# Altium footprint library 10-Diobe.PcbLib: 108 footprints (part 5 of 7)
Each footprint in its own frame and in the unit in brackets; x right, y up, seen from the top. Pads: shape width x height; smd on the part's side, far side on the other; paste and mask are expansions set on the pad; w line width, h text height; cw(c..) or ccw(c..) is an arc to the next point about the centre after c.
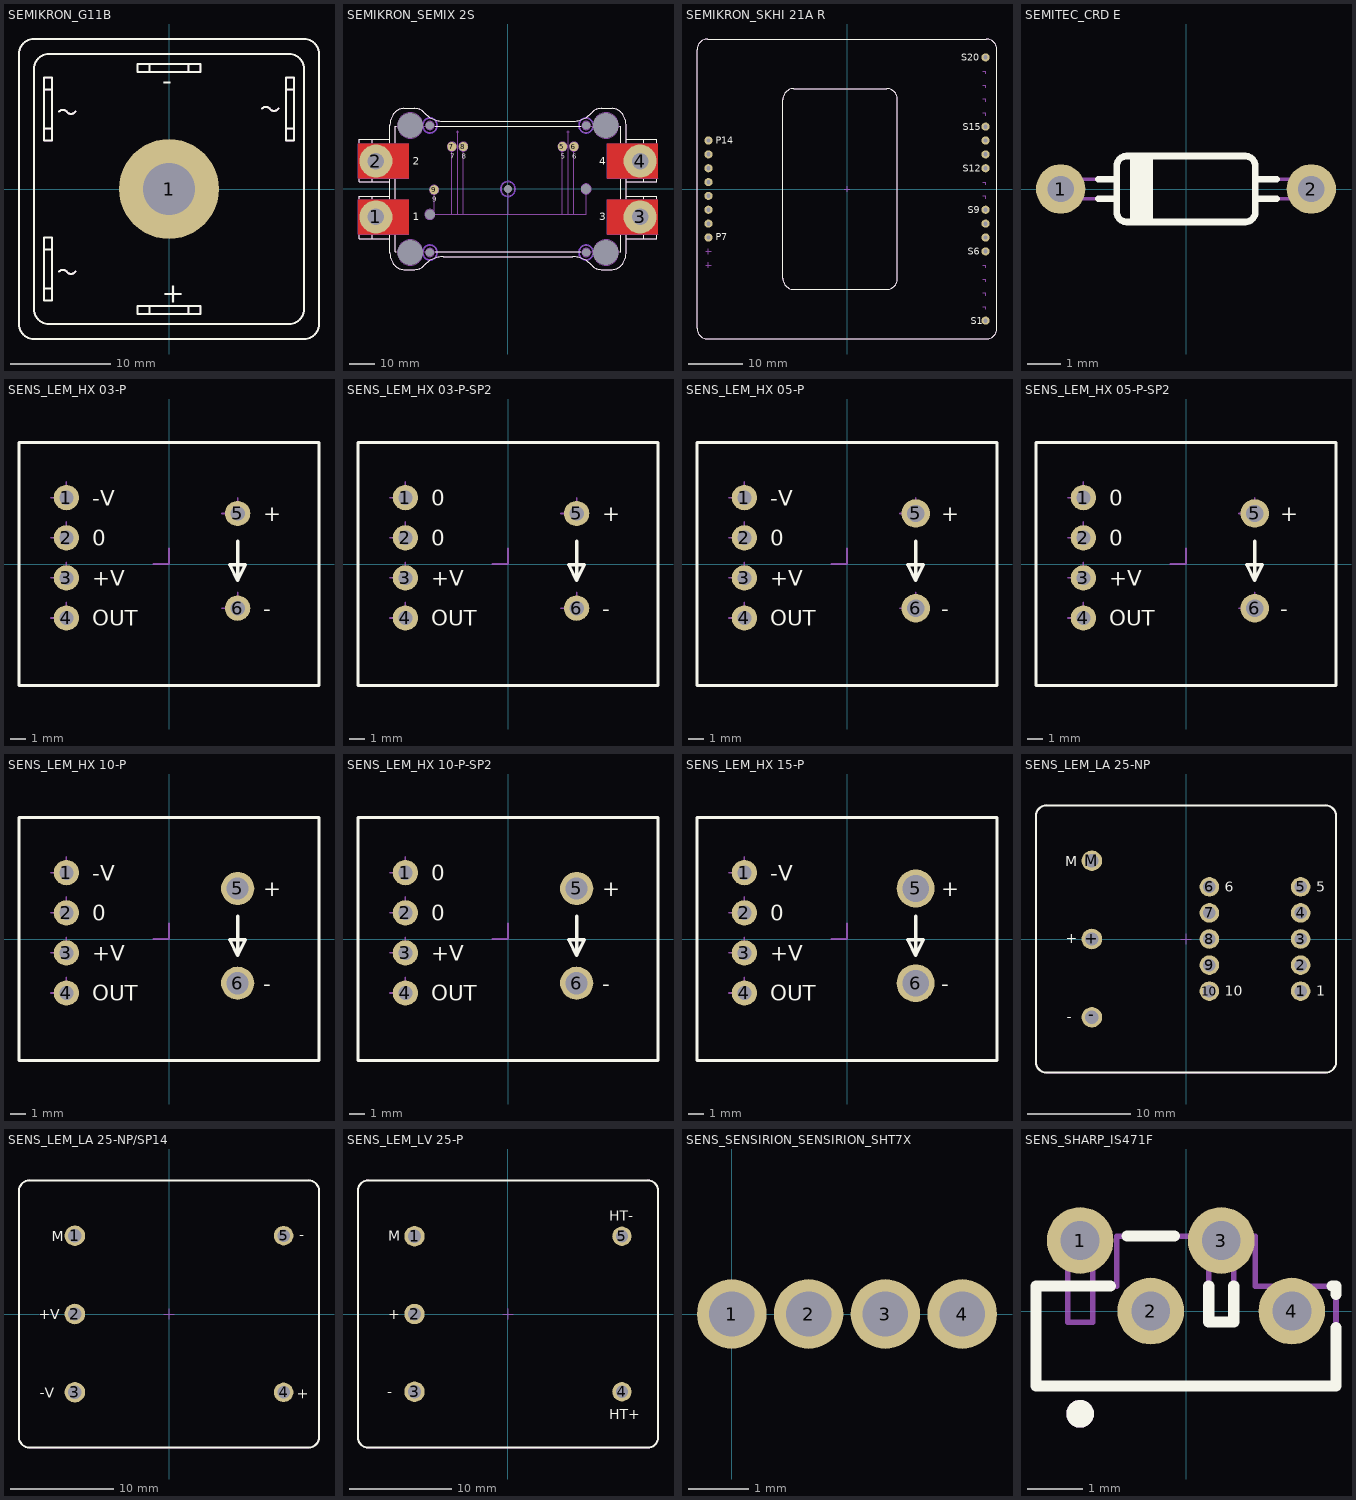
[diagram p4: the footprints below, top view; thin cyan lines are the x and y axes]

## SEMIKRON_G11B [mm] "Three Phase Bridge Bridge, Body 28.8mm x 28.8mm G11b Case"
height 22.5
pads (1):
  round 10 hole 5.2: 1(0,0)
Top Overlay:
  lines w0.2: -12.5,-9.95 -11.7,-9.95 ; -12.5,-6.05 -11.7,-6.05 ; -12.5,6.05 -11.7,6.05 ; -12.5,9.95 -11.7,9.95 ; -10.975,-8.232 cw(c-10.615,-8.579) -10.2,-8.3 ; -10.975,7.768 cw(c-10.615,7.421) -10.2,7.7 ; -10.175,-8.32 ccw(c-9.794,-7.996) -9.365,-8.254 ; -10.175,7.68 ccw(c-9.794,8.004) -9.365,7.746 ; -1.95,-12.5 -1.95,-11.7 ; -1.95,11.7 -1.95,12.5 ; 1.95,-12.5 1.95,-11.7 ; 1.95,11.7 1.95,12.5 ; 9.325,8.068 cw(c9.685,7.721) 10.1,8 ; 10.125,7.98 ccw(c10.506,8.304) 10.935,8.046 ; 11.7,6.05 12.5,6.05 ; 11.7,9.95 12.5,9.95 ; -15,-13.5 ccw(c-13.5,-13.5) -13.5,-15 13.5,-15 ccw(c13.5,-13.5) 15,-13.5 15,13.5 ccw(c13.5,13.5) 13.5,15 -13.5,15 ccw(c-13.5,13.5) -15,13.5 -15,-13.5 ; -13.5,-12 ccw(c-12,-12) -12,-13.5 12,-13.5 ccw(c12,-12) 13.5,-12 13.5,12 ccw(c12,12) 12,13.5 -12,13.5 ccw(c-12,12) -13.5,12 -13.5,-12 ; -12.5,-11.15 -11.7,-11.15 -11.7,-4.85 -12.5,-4.85 -12.5,-11.15 ; -12.5,4.85 -11.7,4.85 -11.7,11.15 -12.5,11.15 -12.5,4.85 ; -3.15,-12.5 -3.15,-11.7 3.15,-11.7 3.15,-12.5 -3.15,-12.5 ; -3.15,11.7 -3.15,12.5 3.15,12.5 3.15,11.7 -3.15,11.7 ; 11.7,4.85 12.5,4.85 12.5,11.15 11.7,11.15 11.7,4.85
  text "+" at -0.7,-11.4 h2
  text "-" at -0.7,9.9 h2
Mechanical 8:
  lines w0.1: -1,0 0,0 ; 0,-1 0,0 ; 0,1 0,0 ; 1,0 0,0
Mechanical 14:
  circle w0.1: c0,0 r2.6
  circle w0.1: c0,0 r4.1
  circle w0.1: c0,0 r2.6
  lines w0.1: -12.5,-9.95 -11.7,-9.95 ; -12.5,-6.05 -11.7,-6.05 ; -12.5,6.05 -11.7,6.05 ; -12.5,9.95 -11.7,9.95 ; -1.95,-12.5 -1.95,-11.7 ; -1.95,11.7 -1.95,12.5 ; 1.95,-12.5 1.95,-11.7 ; 1.95,11.7 1.95,12.5 ; 11.7,6.05 12.5,6.05 ; 11.7,9.95 12.5,9.95 ; -15,-13.5 ccw(c-13.5,-13.5) -13.5,-15 13.5,-15 ccw(c13.5,-13.5) 15,-13.5 15,13.5 ccw(c13.5,13.5) 13.5,15 -13.5,15 ccw(c-13.5,13.5) -15,13.5 -15,-13.5 ; -13.5,-12 ccw(c-12,-12) -12,-13.5 12,-13.5 ccw(c12,-12) 13.5,-12 13.5,12 ccw(c12,12) 12,13.5 -12,13.5 ccw(c-12,12) -13.5,12 -13.5,-12 ; -12.5,-11.15 -11.7,-11.15 -11.7,-4.85 -12.5,-4.85 -12.5,-11.15 ; -12.5,4.85 -11.7,4.85 -11.7,11.15 -12.5,11.15 -12.5,4.85 ; -3.15,-12.5 -3.15,-11.7 3.15,-11.7 3.15,-12.5 -3.15,-12.5 ; -3.15,11.7 -3.15,12.5 3.15,12.5 3.15,11.7 -3.15,11.7 ; 11.7,4.85 12.5,4.85 12.5,11.15 11.7,11.15 11.7,4.85
  lines w0.2: -10.975,-8.232 cw(c-10.615,-8.579) -10.2,-8.3 ; -10.975,-8.232 cw(c-10.615,-8.579) -10.2,-8.3 ; -10.975,-8.232 cw(c-10.615,-8.579) -10.2,-8.3 ; -10.975,7.768 cw(c-10.615,7.421) -10.2,7.7 ; -10.975,7.768 cw(c-10.615,7.421) -10.2,7.7 ; -10.975,7.768 cw(c-10.615,7.421) -10.2,7.7 ; -10.175,-8.32 ccw(c-9.794,-7.996) -9.365,-8.254 ; -10.175,-8.32 ccw(c-9.794,-7.996) -9.365,-8.254 ; -10.175,-8.32 ccw(c-9.794,-7.996) -9.365,-8.254 ; -10.175,7.68 ccw(c-9.794,8.004) -9.365,7.746 ; -10.175,7.68 ccw(c-9.794,8.004) -9.365,7.746 ; -10.175,7.68 ccw(c-9.794,8.004) -9.365,7.746 ; 9.325,8.068 cw(c9.685,7.721) 10.1,8 ; 9.325,8.068 cw(c9.685,7.721) 10.1,8 ; 9.325,8.068 cw(c9.685,7.721) 10.1,8 ; 10.125,7.98 ccw(c10.506,8.304) 10.935,8.046 ; 10.125,7.98 ccw(c10.506,8.304) 10.935,8.046 ; 10.125,7.98 ccw(c10.506,8.304) 10.935,8.046
  text "+" at -0.7,-11.4 h2
  text "-" at -0.7,9.9 h2
  text "-" at -0.7,9.9 h2
  text "+" at -0.7,-11.4 h2
  text "+" at -0.7,-11.4 h2
  text "-" at -0.7,9.9 h2
3D body "SEMIKRON_CASE G11B.stp": height 22.5, standoff 0, extent -15,-15 15,15

## SEMIKRON_SEMIX 2S [mm] "SEMIKRON SEMIX 2s Case"
height 17.5
pads (20):
  round 13 hole 6.5: 1(-52,-11) 2(-52,11) 3(52,-11) 4(52,11)
  round 3.6 smd: 5(21.45,16.7) 6(25.95,16.7) 7(-22.1,16.7) 8(-17.6,16.7) 9(-29.1,-0.3)
  round 1 hole 3.3 unplated mask+1.15: 10(-30.75,25) 11(-30.75,-25) 12(30.75,-25) 13(30.75,25) 14(0,0)
  round 1 hole 4 unplated mask+1.5: 15(-30.75,-10) 16(30.75,0)
  round 1 hole 10 unplated mask+4.5: 17(-38.5,25) 18(-38.5,-25) 19(38.5,-25) 20(38.5,25)
Top Layer:
  region: 39.05,-17.75 59.05,-17.75 59.05,-4.25 39.05,-4.25
  region: 39.05,4.25 59.05,4.25 59.05,17.75 39.05,17.75
  region: -59.05,-17.75 -39.05,-17.75 -39.05,-4.25 -59.05,-4.25
  region: -59.05,4.25 -39.05,4.25 -39.05,17.75 -59.05,17.75
Bottom Layer keep-out:
  circle w0.1: c0,0 r3
  circle w0.1: c-30.75,-25 r3
  circle w0.1: c30.75,-25 r3
  circle w0.1: c30.75,25 r3
  circle w0.1: c-30.75,25 r3
Top Overlay:
  lines w0.2: -58.5,-18.15 -58.5,-19.5 -46.5,-19.5 ; -58.5,-3.85 -58.5,-2.8 -46.5,-2.8 ; -58.5,3.85 -58.5,2.8 -46.5,2.8 ; -58.5,18.15 -58.5,19.5 -46.5,19.5 ; -53.5,-19.5 -53.5,-18.15 ; -53.5,-3.85 -53.5,-2.8 ; -53.5,2.8 -53.5,3.85 ; -53.5,18.15 -53.5,19.5 ; -46.5,-18.15 -46.5,-25 ccw(c-38.5,-25) -45.092,-29.533 ccw(c-40.972,-26.7) -40.972,-31.7 -36.68,-31.7 ccw(c-36.68,-26.7) -32.954,-30.033 cw(c-25.5,-36.7) -25.5,-26.7 25.5,-26.7 cw(c25.5,-36.7) 32.954,-30.033 ccw(c36.68,-26.7) 36.68,-31.7 40.972,-31.7 ccw(c40.972,-26.7) 45.092,-29.533 ccw(c38.5,-25) 46.5,-25 46.5,-18.15 ; -46.5,-3.85 -46.5,3.85 ; -46.5,18.15 -46.5,25 cw(c-38.5,25) -45.092,29.533 cw(c-40.972,26.7) -40.972,31.7 -36.68,31.7 cw(c-36.68,26.7) -32.954,30.033 ccw(c-25.5,36.7) -25.5,26.7 25.5,26.7 ccw(c25.5,36.7) 32.954,30.033 cw(c36.68,26.7) 36.68,31.7 40.972,31.7 cw(c40.972,26.7) 45.092,29.533 cw(c38.5,25) 46.5,25 46.5,18.15 ; -44.45,-18.15 -44.45,-24.8 -43.996,-24.8 ; -44.45,-3.85 -44.45,3.85 ; -44.45,18.15 -44.45,24.8 -43.996,24.8 ; -28.71,-24.8 28.71,-24.8 ; -28.71,24.8 28.71,24.8 ; 43.996,-24.8 44.45,-24.8 44.45,-18.15 ; 43.996,24.8 44.45,24.8 44.45,18.15 ; 44.45,-3.85 44.45,3.85 ; 46.5,-19.5 58.5,-19.5 58.5,-18.15 ; 46.5,-3.85 46.5,3.85 ; 46.5,-2.8 58.5,-2.8 58.5,-3.85 ; 46.5,2.8 58.5,2.8 58.5,3.85 ; 46.5,19.5 58.5,19.5 58.5,18.15 ; 53.5,-19.5 53.5,-18.15 ; 53.5,-3.85 53.5,-2.8 ; 53.5,2.8 53.5,3.85 ; 53.5,18.15 53.5,19.5
  text "9" at -29.8,-5.075 h2
  text "3" at 35.975,-12.3 h3
  text "4" at 35.952,9.5 h3
  text "1" at -37.413,-12.4 h3
  text "2" at -37.5,9.5 h3
  text "6" at 25.25,11.925 h2
  text "5" at 20.75,11.925 h2
  text "8" at -18.259,11.925 h2
  text "7" at -22.81,11.925 h2
Mechanical 8:
  circle w0.1: c-38.5,25 r5
  circle w0.1: c-38.5,-25 r5
  circle w0.1: c38.5,-25 r5
  circle w0.1: c38.5,25 r5
  circle w0.1: c-29.1,-0.3 r1.8
  circle w0.1: c25.95,16.7 r1.8
  circle w0.1: c21.45,16.7 r1.8
  circle w0.1: c-17.6,16.7 r1.8
  circle w0.1: c-22.1,16.7 r1.8
  circle w0.1: c-30.75,25 r1.65
  circle w0.1: c30.75,25 r1.65
  circle w0.1: c30.75,-25 r1.65
  circle w0.1: c-30.75,-25 r1.65
  circle w0.1: c-30.75,-10 r2
  circle w0.1: c30.75,0 r2
  circle w0.1: c-52,11 r3.25
  circle w0.1: c-52,-11 r3.25
  circle w0.1: c52,-11 r3.25
  circle w0.1: c52,11 r3.25
  circle w0.1: c30.75,-25 r2.75
  circle w0.1: c-30.75,-25 r2.75
  circle w0.1: c-30.75,25 r2.75
  circle w0.1: c30.75,25 r2.75
  circle w0.1: c0,0 r2.75
  lines w0.1: -52.5,-11 -52,-11 ; -52.5,11 -52,11 ; -52,-11.5 -52,-11 ; -52,-10.5 -52,-11 ; -52,10.5 -52,11 ; -52,11.5 -52,11 ; -51.5,-11 -52,-11 ; -51.5,11 -52,11 ; -39,-25 -38.5,-25 ; -39,25 -38.5,25 ; -38.5,-25.5 -38.5,-25 ; -38.5,-24.5 -38.5,-25 ; -38.5,24.5 -38.5,25 ; -38.5,25.5 -38.5,25 ; -38,-25 -38.5,-25 ; -38,25 -38.5,25 ; -31.25,-25 -30.75,-25 ; -31.25,-10 -30.75,-10 ; -31.25,25 -30.75,25 ; -30.75,-25.5 -30.75,-25 ; -30.75,-24.5 -30.75,-25 ; -30.75,-10.5 -30.75,-10 ; -30.75,-9.5 -30.75,-10 ; -30.75,24.5 -30.75,25 ; -30.75,25.5 -30.75,25 ; -30.25,-25 -30.75,-25 ; -30.25,-10 -30.75,-10 ; -30.25,25 -30.75,25 ; -29.6,-0.3 -29.1,-0.3 ; -29.1,-10 -29.1,-0.3 ; -29.1,-0.8 -29.1,-0.3 ; -29.1,0.2 -29.1,-0.3 ; -28.6,-0.3 -29.1,-0.3 ; -22.6,16.7 -22.1,16.7 ; -22.1,-10 -22.1,16.7 ; -22.1,16.2 -22.1,16.7 ; -22.1,17.2 -22.1,16.7 ; -21.6,16.7 -22.1,16.7 ; -20.35,22.45 -19.85,22.45 ; -19.85,-10 -19.85,22.45 ; -19.85,21.95 -19.85,22.45 ; -19.85,22.95 -19.85,22.45 ; -19.35,22.45 -19.85,22.45 ; -18.1,16.7 -17.6,16.7 ; -17.6,-10 -17.6,16.7 ; -17.6,16.2 -17.6,16.7 ; -17.6,17.2 -17.6,16.7 ; -17.1,16.7 -17.6,16.7 ; -0.5,0 0,0 ; 0,-10 0,0 ; 0,-0.5 0,0 ; 0,0.5 0,0 ; 0.5,0 0,0 ; 20.95,16.7 21.45,16.7 ; 21.45,-10 21.45,16.7 ; 21.45,16.2 21.45,16.7 ; 21.45,17.2 21.45,16.7 ; 21.95,16.7 21.45,16.7 ; 23.2,22.45 23.7,22.45 ; 23.7,-10 23.7,22.45 ; 23.7,21.95 23.7,22.45 ; 23.7,22.95 23.7,22.45 ; 24.2,22.45 23.7,22.45 ; 25.45,16.7 25.95,16.7 ; 25.95,-10 25.95,16.7 ; 25.95,16.2 25.95,16.7 ; 25.95,17.2 25.95,16.7 ; 26.45,16.7 25.95,16.7 ; 30.25,-25 30.75,-25 ; 30.25,0 30.75,0 ; 30.25,25 30.75,25 ; 30.75,-25.5 30.75,-25 ; 30.75,-24.5 30.75,-25 ; 30.75,-0.5 30.75,0 ; 30.75,0.5 30.75,0 ; 30.75,24.5 30.75,25 ; 30.75,25.5 30.75,25 ; 31.25,-25 30.75,-25 ; 31.25,0 30.75,0 ; 31.25,25 30.75,25 ; 38,-25 38.5,-25 ; 38,25 38.5,25 ; 38.5,-25.5 38.5,-25 ; 38.5,-24.5 38.5,-25 ; 38.5,24.5 38.5,25 ; 38.5,25.5 38.5,25 ; 39,-25 38.5,-25 ; 39,25 38.5,25 ; 51.5,-11 52,-11 ; 51.5,11 52,11 ; 52,-11.5 52,-11 ; 52,-10.5 52,-11 ; 52,10.5 52,11 ; 52,11.5 52,11 ; 52.5,-11 52,-11 ; 52.5,11 52,11 ; -59.05,-17.75 -39.05,-17.75 -39.05,-4.25 -59.05,-4.25 ; -59.05,-17.75 -59.05,-4.25 ; -59.05,-17.75 -49.05,-11 -59.05,-4.25 ; -59.05,4.25 -59.05,17.75 ; -59.05,4.25 -39.05,4.25 -39.05,17.75 -59.05,17.75 ; -59.05,4.25 -49.05,11 -59.05,17.75 ; -30.75,-10 30.75,-10 30.75,0 ; 59.05,-17.75 39.05,-17.75 39.05,-4.25 59.05,-4.25 ; 59.05,-17.75 59.05,-4.25 ; 59.05,-17.75 49.05,-11 59.05,-4.25 ; 59.05,4.25 39.05,4.25 39.05,17.75 59.05,17.75 ; 59.05,4.25 59.05,17.75 ; 59.05,4.25 49.05,11 59.05,17.75
Mechanical 14:
  circle w0.1: c-38.5,25 r3.4
  circle w0.1: c-38.5,25 r2.7
  circle w0.1: c38.5,25 r3.4
  circle w0.1: c38.5,25 r2.7
  circle w0.1: c38.5,-25 r3.4
  circle w0.1: c38.5,-25 r2.7
  circle w0.1: c-38.5,-25 r3.4
  circle w0.1: c-38.5,-25 r2.7
  lines w0.1: -53.5,-19.5 -53.5,-2.8 ; -53.5,2.8 -53.5,19.5 ; -46.5,-19.5 -58.5,-19.5 -58.5,-2.8 -46.5,-2.8 ; -46.5,2.8 -58.5,2.8 -58.5,19.5 -46.5,19.5 ; 46.5,-19.5 58.5,-19.5 58.5,-2.8 46.5,-2.8 ; 46.5,2.8 58.5,2.8 58.5,19.5 46.5,19.5 ; 53.5,-19.5 53.5,-2.8 ; 53.5,2.8 53.5,19.5 ; -58.05,-16.75 -40.05,-16.75 -40.05,-5.25 -58.05,-5.25 -58.05,-16.75 ; -58.05,5.25 -58.05,16.75 -40.05,16.75 -40.05,5.25 -58.05,5.25 ; -46.5,-25 ccw(c-38.5,-25) -45.092,-29.533 ccw(c-40.972,-26.7) -40.972,-31.7 -36.68,-31.7 ccw(c-36.68,-26.7) -32.954,-30.033 cw(c-25.5,-36.7) -25.5,-26.7 25.5,-26.7 cw(c25.5,-36.7) 32.954,-30.033 ccw(c36.68,-26.7) 36.68,-31.7 40.972,-31.7 ccw(c40.972,-26.7) 45.092,-29.533 ccw(c38.5,-25) 46.5,-25 46.5,25 ccw(c38.5,25) 45.092,29.533 ccw(c40.972,26.7) 40.972,31.7 36.68,31.7 ccw(c36.68,26.7) 32.954,30.033 cw(c25.5,36.7) 25.5,26.7 -25.5,26.7 cw(c-25.5,36.7) -32.954,30.033 ccw(c-36.68,26.7) -36.68,31.7 -40.972,31.7 ccw(c-40.972,26.7) -45.092,29.533 ccw(c-38.5,25) -46.5,25 -46.5,-25 ; -44.45,-24.8 -44.45,24.8 -41.994,24.8 ccw(c-38.5,25) -35.006,24.8 35.006,24.8 ccw(c38.5,25) 41.994,24.8 44.45,24.8 44.45,-24.8 41.994,-24.8 ccw(c38.5,-24.992) 35.006,-24.8 -35.006,-24.8 ccw(c-38.5,-25) -41.994,-24.8 -44.45,-24.8 ; 40.05,-16.75 40.05,-5.25 58.05,-5.25 58.05,-16.75 40.05,-16.75 ; 40.05,5.25 40.05,16.75 58.05,16.75 58.05,5.25 40.05,5.25
  text "9" at -29.8,-5.075 h2
  text "3" at 35.975,-12.3 h3
  text "4" at 35.952,9.5 h3
  text "1" at -37.413,-12.4 h3
  text "2" at -37.5,9.5 h3
  text "6" at 25.25,11.925 h2
  text "5" at 20.75,11.925 h2
  text "8" at -18.259,11.925 h2
  text "7" at -22.81,11.925 h2
3D body "SEMIKRON_SEMIX 2S.stp": height 17.5, standoff -5.5, extent -58.5,-31.7 58.5,31.7

## SEMIKRON_SKHI 21A R [mm] "SEMIKRON SKHI 21A R Case"
height 16
pads (18):
  round 1.5 hole 0.8: P7(-25.4,-8.89) P8(-25.4,-6.35) P9(-25.4,-3.81) P10(-25.4,-1.27) P11(-25.4,1.27) P12(-25.4,3.81) P13(-25.4,6.35) P14(-25.4,8.89) S1(25.4,-24.13) S6(25.4,-11.43) S7(25.4,-8.89) S8(25.4,-6.35) S9(25.4,-3.81) S12(25.4,3.81) S13(25.4,6.35) S14(25.4,8.89) S15(25.4,11.43) S20(25.4,24.13)
Top Overlay:
  lines w0.2: -27.5,-25.5 ccw(c-25.5,-25.5) -25.5,-27.5 25.5,-27.5 ccw(c25.5,-25.5) 27.5,-25.5 27.5,25.5 ccw(c25.5,25.5) 25.5,27.5 -25.5,27.5 ccw(c-25.5,25.5) -27.5,25.5 -27.5,-25.5 ; -11.75,-16.4 ccw(c-9.75,-16.4) -9.75,-18.4 7.25,-18.4 ccw(c7.25,-16.4) 9.25,-16.4 9.25,16.4 ccw(c7.25,16.4) 7.25,18.4 -9.75,18.4 ccw(c-9.75,16.4) -11.75,16.4 -11.75,-16.4
  text "S1" at 22.68,-24.78 h1.27
  text "S6" at 22.18,-12.08 h1.27
  text "S9" at 22.18,-4.46 h1.27
  text "S12" at 21.227,3.16 h1.27
  text "S15" at 21.18,10.78 h1.27
  text "S20" at 20.98,23.48 h1.27
  text "P14" at -24.08,8.34 h1.27
  text "P7" at -24.08,-9.44 h1.27
Mechanical 8:
  lines w0.1: -25.9,-13.97 -25.4,-13.97 ; -25.9,-11.43 -25.4,-11.43 ; -25.9,-8.89 -25.4,-8.89 ; -25.9,-6.35 -25.4,-6.35 ; -25.9,-3.81 -25.4,-3.81 ; -25.9,-1.27 -25.4,-1.27 ; -25.9,1.27 -25.4,1.27 ; -25.9,3.81 -25.4,3.81 ; -25.9,6.35 -25.4,6.35 ; -25.9,8.89 -25.4,8.89 ; -25.4,-14.47 -25.4,-13.97 ; -25.4,-13.47 -25.4,-13.97 ; -25.4,-11.93 -25.4,-11.43 ; -25.4,-10.93 -25.4,-11.43 ; -25.4,-9.39 -25.4,-8.89 ; -25.4,-8.39 -25.4,-8.89 ; -25.4,-6.85 -25.4,-6.35 ; -25.4,-5.85 -25.4,-6.35 ; -25.4,-4.31 -25.4,-3.81 ; -25.4,-3.31 -25.4,-3.81 ; -25.4,-1.77 -25.4,-1.27 ; -25.4,-0.77 -25.4,-1.27 ; -25.4,0.77 -25.4,1.27 ; -25.4,1.77 -25.4,1.27 ; -25.4,3.31 -25.4,3.81 ; -25.4,4.31 -25.4,3.81 ; -25.4,5.85 -25.4,6.35 ; -25.4,6.85 -25.4,6.35 ; -25.4,8.39 -25.4,8.89 ; -25.4,9.39 -25.4,8.89 ; -24.9,-13.97 -25.4,-13.97 ; -24.9,-11.43 -25.4,-11.43 ; -24.9,-8.89 -25.4,-8.89 ; -24.9,-6.35 -25.4,-6.35 ; -24.9,-3.81 -25.4,-3.81 ; -24.9,-1.27 -25.4,-1.27 ; -24.9,1.27 -25.4,1.27 ; -24.9,3.81 -25.4,3.81 ; -24.9,6.35 -25.4,6.35 ; -24.9,8.89 -25.4,8.89 ; -0.5,0 0,0 ; 0,-0.5 0,0 ; 0,0.5 0,0 ; 0.5,0 0,0 ; 24.9,-24.13 25.4,-24.13 ; 24.9,-21.59 25.4,-21.59 25.4,-22.09 ; 24.9,-19.05 25.4,-19.05 25.4,-19.55 ; 24.9,-16.51 25.4,-16.51 25.4,-17.01 ; 24.9,-13.97 25.4,-13.97 25.4,-14.47 ; 24.9,-11.43 25.4,-11.43 ; 24.9,-8.89 25.4,-8.89 ; 24.9,-6.35 25.4,-6.35 ; 24.9,-3.81 25.4,-3.81 ; 24.9,-1.27 25.4,-1.27 25.4,-1.77 ; 24.9,1.27 25.4,1.27 25.4,0.77 ; 24.9,3.81 25.4,3.81 ; 24.9,6.35 25.4,6.35 ; 24.9,8.89 25.4,8.89 ; 24.9,11.43 25.4,11.43 ; 24.9,13.97 25.4,13.97 25.4,13.47 ; 24.9,16.51 25.4,16.51 25.4,16.01 ; 24.9,19.05 25.4,19.05 25.4,18.55 ; 24.9,21.59 25.4,21.59 25.4,21.09 ; 24.9,24.13 25.4,24.13 ; 25.4,-24.63 25.4,-24.13 ; 25.4,-23.63 25.4,-24.13 ; 25.4,-11.93 25.4,-11.43 ; 25.4,-10.93 25.4,-11.43 ; 25.4,-9.39 25.4,-8.89 ; 25.4,-8.39 25.4,-8.89 ; 25.4,-6.85 25.4,-6.35 ; 25.4,-5.85 25.4,-6.35 ; 25.4,-4.31 25.4,-3.81 ; 25.4,-3.31 25.4,-3.81 ; 25.4,3.31 25.4,3.81 ; 25.4,4.31 25.4,3.81 ; 25.4,5.85 25.4,6.35 ; 25.4,6.85 25.4,6.35 ; 25.4,8.39 25.4,8.89 ; 25.4,9.39 25.4,8.89 ; 25.4,10.93 25.4,11.43 ; 25.4,11.93 25.4,11.43 ; 25.4,23.63 25.4,24.13 ; 25.4,24.63 25.4,24.13 ; 25.9,-24.13 25.4,-24.13 ; 25.9,-11.43 25.4,-11.43 ; 25.9,-8.89 25.4,-8.89 ; 25.9,-6.35 25.4,-6.35 ; 25.9,-3.81 25.4,-3.81 ; 25.9,3.81 25.4,3.81 ; 25.9,6.35 25.4,6.35 ; 25.9,8.89 25.4,8.89 ; 25.9,11.43 25.4,11.43 ; 25.9,24.13 25.4,24.13
Mechanical 14:
  lines w0.1: -27.5,-25.5 ccw(c-25.5,-25.5) -25.5,-27.5 25.5,-27.5 ccw(c25.5,-25.5) 27.5,-25.5 27.5,25.5 ccw(c25.5,25.5) 25.5,27.5 -25.5,27.5 ccw(c-25.5,25.5) -27.5,25.5 -27.5,-25.5 ; -11.75,-16.4 ccw(c-9.75,-16.4) -9.75,-18.4 7.25,-18.4 ccw(c7.25,-16.4) 9.25,-16.4 9.25,16.4 ccw(c7.25,16.4) 7.25,18.4 -9.75,18.4 ccw(c-9.75,16.4) -11.75,16.4 -11.75,-16.4
  text "S1" at 22.68,-24.78 h1.27
  text "S6" at 22.18,-12.08 h1.27
  text "S9" at 22.18,-4.46 h1.27
  text "S12" at 21.227,3.16 h1.27
  text "S15" at 21.18,10.78 h1.27
  text "S20" at 20.98,23.48 h1.27
  text "P14" at -24.08,8.34 h1.27
  text "P7" at -24.08,-9.44 h1.27
3D body "SEMIKRON_SKHI 21A R.stp": height 16, standoff -3.5, extent -27.5,-27.5 27.5,27.5

## SEMITEC_CRD E [mm] "CRD Diode, Lead spacing 7.62mm Body 4.2mm X 2mm, SEMITEC Case Type CRD E"
height 2
pads (2):
  round 1.5 hole 0.8: 1(-3.8,0) 2(3.8,0)
Top Overlay:
  lines w0.2: -2.66,-0.3 -2.1,-0.3 ; -2.66,0.3 -2.1,0.3 ; -1.6,-1 -1.6,1 ; -1.5,-1 -1.5,1 ; -1.4,-1 -1.4,1 ; -1.3,-1 -1.3,1 ; -1.2,-1 -1.2,1 ; -1.1,-1 -1.1,1 ; 2.1,-0.3 2.752,-0.3 ; 2.1,0.3 2.752,0.3 ; -2.1,-0.7 ccw(c-1.8,-0.7) -1.8,-1 1.8,-1 ccw(c1.8,-0.7) 2.1,-0.7 2.1,0.7 ccw(c1.8,0.7) 1.8,1 -1.8,1 ccw(c-1.8,0.7) -2.1,0.7 -2.1,-0.7
Mechanical 14:
  lines w0.1: -2.1,-0.3 -3.81,-0.3 cw(c-3.81,0) -3.81,0.3 -2.1,0.3 ; -1.6,-1 -1.6,1 ; -1.55,-1 -1.55,1 ; -1.5,-1 -1.5,1 ; -1.45,-1 -1.45,1 ; -1.4,-1 -1.4,1 ; -1.35,-1 -1.35,1 ; -1.3,-1 -1.3,1 ; -1.25,-1 -1.25,1 ; -1.2,-1 -1.2,1 ; -1.15,-1 -1.15,1 ; -1.1,-1 -1.1,1 ; 2.1,-0.3 3.81,-0.3 ccw(c3.81,0) 3.81,0.3 2.1,0.3 ; -2.1,-0.7 ccw(c-1.8,-0.7) -1.8,-1 1.8,-1 ccw(c1.8,-0.7) 2.1,-0.7 2.1,0.7 ccw(c1.8,0.7) 1.8,1 -1.8,1 ccw(c-1.8,0.7) -2.1,0.7 -2.1,-0.7
3D body "v150-090.stp": height 0.02, standoff -1.65, extent 3.05,-0.75 4.55,0.75
3D body "v150-090.stp": height 0.02, standoff -1.65, extent -4.55,-0.75 -3.05,0.75
3D body "E-103.stp": height 2, standoff -3.1, extent -4.11,-1 4.11,1

## SENS_LEM_HX 03-P [mm] "LEM Current Transducer, Body 19x15.4mm (max)"
height 20
pads (6):
  round 1.6 hole 0.9: 1(-6.5,4.2) 2(-6.5,1.66) 3(-6.5,-0.88) 4(-6.5,-3.42) 5(4.35,3.2) 6(4.35,-2.8)
Top Overlay:
  lines w0.2: 4.35,1.45 4.35,-1.05 ; 4.35,-1.05 3.85,-0.05 4.85,-0.05 4.35,-1.05 ; -9.5,-7.7 9.5,-7.7 9.5,7.7 -9.5,7.7 -9.5,-7.7
  text "-V" at -4.865,3.7 h1
  text "0" at -4.865,1.16 h1
  text "+V" at -4.865,-1.38 h1
  text "OUT" at -4.865,-3.92 h1
  text "+" at 5.985,2.7 h1
  text "-" at 5.985,-3.3 h1
Mechanical 8:
  circle w0.1: c4.35,3.2 r0.3
  circle w0.1: c4.35,-2.8 r0.3
  lines w0.1: -7.5,-3.42 -6.5,-3.42 -6.5,-2.42 ; -7.5,-0.88 -6.5,-0.88 -6.5,0.12 ; -7.5,1.66 -6.5,1.66 -6.5,2.66 ; -7.5,4.2 -6.5,4.2 -6.5,5.2 ; -1,0 0,0 0,1 ; 3.35,-2.8 4.35,-2.8 4.35,-1.8 ; 3.35,3.2 4.35,3.2 4.35,4.2 ; -6.625,-3.67 -6.375,-3.67 -6.375,-3.17 -6.625,-3.17 -6.625,-3.67 ; -6.625,-1.13 -6.375,-1.13 -6.375,-0.63 -6.625,-0.63 -6.625,-1.13 ; -6.625,1.41 -6.375,1.41 -6.375,1.91 -6.625,1.91 -6.625,1.41 ; -6.625,3.95 -6.375,3.95 -6.375,4.45 -6.625,4.45 -6.625,3.95
Mechanical 14:
  lines w0.1: 4.35,1.45 4.35,-1.05 ; 4.35,-1.05 4.85,-0.05 3.85,-0.05 4.35,-1.05 ; -9.5,-7.7 -9.5,7.7 9.5,7.7 9.5,-7.7 -9.5,-7.7
  text "OUT" at -4.865,-3.92 h1
  text "+V" at -4.865,-1.38 h1
  text "0" at -4.865,1.16 h1
  text "-V" at -4.865,3.7 h1
  text "+" at 5.985,2.7 h1
  text "-" at 5.985,-3.3 h1
3D body "SENS_LEM_HX 03-P.stp": height 20, standoff -4, extent -9.5,-7.7 9.5,7.7

## SENS_LEM_HX 03-P-SP2 [mm] "LEM Current Transducer, Body 19x15.4mm (max)"
height 20
pads (6):
  round 1.6 hole 0.9: 1(-6.5,4.2) 2(-6.5,1.66) 3(-6.5,-0.88) 4(-6.5,-3.42) 5(4.35,3.2) 6(4.35,-2.8)
Top Overlay:
  lines w0.2: 4.35,1.45 4.35,-1.05 ; 4.35,-1.05 3.85,-0.05 4.85,-0.05 4.35,-1.05 ; -9.5,-7.7 9.5,-7.7 9.5,7.7 -9.5,7.7 -9.5,-7.7
  text "0" at -4.865,3.7 h1
  text "0" at -4.865,1.16 h1
  text "+V" at -4.865,-1.38 h1
  text "OUT" at -4.865,-3.92 h1
  text "+" at 5.985,2.7 h1
  text "-" at 5.985,-3.3 h1
Mechanical 8:
  circle w0.1: c4.35,3.2 r0.3
  circle w0.1: c4.35,-2.8 r0.3
  lines w0.1: -7.5,-3.42 -6.5,-3.42 -6.5,-2.42 ; -7.5,-0.88 -6.5,-0.88 -6.5,0.12 ; -7.5,1.66 -6.5,1.66 -6.5,2.66 ; -7.5,4.2 -6.5,4.2 -6.5,5.2 ; -1,0 0,0 0,1 ; 3.35,-2.8 4.35,-2.8 4.35,-1.8 ; 3.35,3.2 4.35,3.2 4.35,4.2 ; -6.625,-3.67 -6.375,-3.67 -6.375,-3.17 -6.625,-3.17 -6.625,-3.67 ; -6.625,-1.13 -6.375,-1.13 -6.375,-0.63 -6.625,-0.63 -6.625,-1.13 ; -6.625,1.41 -6.375,1.41 -6.375,1.91 -6.625,1.91 -6.625,1.41 ; -6.625,3.95 -6.375,3.95 -6.375,4.45 -6.625,4.45 -6.625,3.95
Mechanical 14:
  lines w0.1: 4.35,1.45 4.35,-1.05 ; 4.35,-1.05 4.85,-0.05 3.85,-0.05 4.35,-1.05 ; -9.5,-7.7 -9.5,7.7 9.5,7.7 9.5,-7.7 -9.5,-7.7
  text "OUT" at -4.865,-3.92 h1
  text "+V" at -4.865,-1.38 h1
  text "0" at -4.865,1.16 h1
  text "0" at -4.865,3.7 h1
  text "+" at 5.985,2.7 h1
  text "-" at 5.985,-3.3 h1
3D body "SENS_LEM_HX 03-P-SP2.stp": height 20, standoff -4, extent -9.5,-7.7 9.5,7.7

## SENS_LEM_HX 05-P [mm] "LEM Current Transducer, Body 19x15.4mm (max)"
height 20
pads (6):
  round 1.6 hole 0.9: 1(-6.5,4.2) 2(-6.5,1.66) 3(-6.5,-0.88) 4(-6.5,-3.42)
  round 1.8 hole 1.1: 5(4.35,3.2) 6(4.35,-2.8)
Top Overlay:
  lines w0.2: 4.35,1.45 4.35,-1.05 ; 4.35,-1.05 4.85,-0.05 3.85,-0.05 4.35,-1.05 ; -9.5,-7.7 -9.5,7.7 9.5,7.7 9.5,-7.7 -9.5,-7.7
  text "-" at 5.985,-3.3 h1
  text "+" at 5.985,2.7 h1
  text "OUT" at -4.865,-3.92 h1
  text "+V" at -4.865,-1.38 h1
  text "0" at -4.865,1.16 h1
  text "-V" at -4.865,3.7 h1
Mechanical 8:
  circle w0.1: c4.35,-2.8 r0.3
  circle w0.1: c4.35,3.2 r0.3
  lines w0.1: -7.5,-3.42 -6.5,-3.42 -6.5,-2.42 ; -7.5,-0.88 -6.5,-0.88 -6.5,0.12 ; -7.5,1.66 -6.5,1.66 -6.5,2.66 ; -7.5,4.2 -6.5,4.2 -6.5,5.2 ; -1,0 0,0 0,1 ; 3.35,-2.8 4.35,-2.8 4.35,-1.8 ; 3.35,3.2 4.35,3.2 4.35,4.2 ; -6.625,-3.67 -6.625,-3.17 -6.375,-3.17 -6.375,-3.67 -6.625,-3.67 ; -6.625,-1.13 -6.625,-0.63 -6.375,-0.63 -6.375,-1.13 -6.625,-1.13 ; -6.625,1.41 -6.625,1.91 -6.375,1.91 -6.375,1.41 -6.625,1.41 ; -6.625,3.95 -6.625,4.45 -6.375,4.45 -6.375,3.95 -6.625,3.95
Mechanical 14:
  lines w0.1: 4.35,1.45 4.35,-1.05 ; 4.35,-1.05 3.85,-0.05 4.85,-0.05 4.35,-1.05 ; -9.5,-7.7 9.5,-7.7 9.5,7.7 -9.5,7.7 -9.5,-7.7
  text "-" at 5.985,-3.3 h1
  text "+" at 5.985,2.7 h1
  text "-V" at -4.865,3.7 h1
  text "0" at -4.865,1.16 h1
  text "+V" at -4.865,-1.38 h1
  text "OUT" at -4.865,-3.92 h1
3D body "SENS_LEM_HX 05-P.stp": height 20, standoff -4, extent -9.5,-7.7 9.5,7.7

## SENS_LEM_HX 05-P-SP2 [mm] "LEM Current Transducer, Body 19x15.4mm (max)"
height 20
pads (6):
  round 1.6 hole 0.9: 1(-6.5,4.2) 2(-6.5,1.66) 3(-6.5,-0.88) 4(-6.5,-3.42)
  round 1.8 hole 1.1: 5(4.35,3.2) 6(4.35,-2.8)
Top Overlay:
  lines w0.2: 4.35,1.45 4.35,-1.05 ; 4.35,-1.05 4.85,-0.05 3.85,-0.05 4.35,-1.05 ; -9.5,-7.7 -9.5,7.7 9.5,7.7 9.5,-7.7 -9.5,-7.7
  text "-" at 5.985,-3.3 h1
  text "+" at 5.985,2.7 h1
  text "OUT" at -4.865,-3.92 h1
  text "+V" at -4.865,-1.38 h1
  text "0" at -4.865,1.16 h1
  text "0" at -4.865,3.7 h1
Mechanical 8:
  circle w0.1: c4.35,-2.8 r0.3
  circle w0.1: c4.35,3.2 r0.3
  lines w0.1: -7.5,-3.42 -6.5,-3.42 -6.5,-2.42 ; -7.5,-0.88 -6.5,-0.88 -6.5,0.12 ; -7.5,1.66 -6.5,1.66 -6.5,2.66 ; -7.5,4.2 -6.5,4.2 -6.5,5.2 ; -1,0 0,0 0,1 ; 3.35,-2.8 4.35,-2.8 4.35,-1.8 ; 3.35,3.2 4.35,3.2 4.35,4.2 ; -6.625,-3.67 -6.625,-3.17 -6.375,-3.17 -6.375,-3.67 -6.625,-3.67 ; -6.625,-1.13 -6.625,-0.63 -6.375,-0.63 -6.375,-1.13 -6.625,-1.13 ; -6.625,1.41 -6.625,1.91 -6.375,1.91 -6.375,1.41 -6.625,1.41 ; -6.625,3.95 -6.625,4.45 -6.375,4.45 -6.375,3.95 -6.625,3.95
Mechanical 14:
  lines w0.1: 4.35,1.45 4.35,-1.05 ; 4.35,-1.05 3.85,-0.05 4.85,-0.05 4.35,-1.05 ; -9.5,-7.7 9.5,-7.7 9.5,7.7 -9.5,7.7 -9.5,-7.7
  text "-" at 5.985,-3.3 h1
  text "+" at 5.985,2.7 h1
  text "0" at -4.865,3.7 h1
  text "0" at -4.865,1.16 h1
  text "+V" at -4.865,-1.38 h1
  text "OUT" at -4.865,-3.92 h1
3D body "SENS_LEM_HX 05-P-SP2.stp": height 20, standoff -4, extent -9.5,-7.7 9.5,7.7

## SENS_LEM_HX 10-P [mm] "LEM Current Transducer, Body 19x15.4mm (max)"
height 20
pads (6):
  round 1.6 hole 0.9: 1(-6.5,4.2) 2(-6.5,1.66) 3(-6.5,-0.88) 4(-6.5,-3.42)
  round 2.1 hole 1.4: 5(4.35,3.2) 6(4.35,-2.8)
Top Overlay:
  lines w0.2: 4.35,1.45 4.35,-1.05 ; 4.35,-1.05 4.85,-0.05 3.85,-0.05 4.35,-1.05 ; -9.5,-7.7 -9.5,7.7 9.5,7.7 9.5,-7.7 -9.5,-7.7
  text "-" at 5.985,-3.3 h1
  text "+" at 5.985,2.7 h1
  text "OUT" at -4.865,-3.92 h1
  text "+V" at -4.865,-1.38 h1
  text "0" at -4.865,1.16 h1
  text "-V" at -4.865,3.7 h1
Mechanical 8:
  circle w0.1: c4.35,-2.8 r0.3
  circle w0.1: c4.35,3.2 r0.3
  lines w0.1: -7.5,-3.42 -6.5,-3.42 -6.5,-2.42 ; -7.5,-0.88 -6.5,-0.88 -6.5,0.12 ; -7.5,1.66 -6.5,1.66 -6.5,2.66 ; -7.5,4.2 -6.5,4.2 -6.5,5.2 ; -1,0 0,0 0,1 ; 3.35,-2.8 4.35,-2.8 4.35,-1.8 ; 3.35,3.2 4.35,3.2 4.35,4.2 ; -6.625,-3.67 -6.625,-3.17 -6.375,-3.17 -6.375,-3.67 -6.625,-3.67 ; -6.625,-1.13 -6.625,-0.63 -6.375,-0.63 -6.375,-1.13 -6.625,-1.13 ; -6.625,1.41 -6.625,1.91 -6.375,1.91 -6.375,1.41 -6.625,1.41 ; -6.625,3.95 -6.625,4.45 -6.375,4.45 -6.375,3.95 -6.625,3.95
Mechanical 14:
  lines w0.1: 4.35,1.45 4.35,-1.05 ; 4.35,-1.05 3.85,-0.05 4.85,-0.05 4.35,-1.05 ; -9.5,-7.7 9.5,-7.7 9.5,7.7 -9.5,7.7 -9.5,-7.7
  text "-" at 5.985,-3.3 h1
  text "+" at 5.985,2.7 h1
  text "-V" at -4.865,3.7 h1
  text "0" at -4.865,1.16 h1
  text "+V" at -4.865,-1.38 h1
  text "OUT" at -4.865,-3.92 h1
3D body "SENS_LEM_HX 10-P.stp": height 20, standoff -4, extent -9.5,-7.7 9.5,7.7

## SENS_LEM_HX 10-P-SP2 [mm] "LEM Current Transducer, Body 19x15.4mm (max)"
height 20
pads (6):
  round 1.6 hole 0.9: 1(-6.5,4.2) 2(-6.5,1.66) 3(-6.5,-0.88) 4(-6.5,-3.42)
  round 2.1 hole 1.4: 5(4.35,3.2) 6(4.35,-2.8)
Top Overlay:
  lines w0.2: 4.35,1.45 4.35,-1.05 ; 4.35,-1.05 4.85,-0.05 3.85,-0.05 4.35,-1.05 ; -9.5,-7.7 -9.5,7.7 9.5,7.7 9.5,-7.7 -9.5,-7.7
  text "-" at 5.985,-3.3 h1
  text "+" at 5.985,2.7 h1
  text "OUT" at -4.865,-3.92 h1
  text "+V" at -4.865,-1.38 h1
  text "0" at -4.865,1.16 h1
  text "0" at -4.865,3.7 h1
Mechanical 8:
  circle w0.1: c4.35,-2.8 r0.3
  circle w0.1: c4.35,3.2 r0.3
  lines w0.1: -7.5,-3.42 -6.5,-3.42 -6.5,-2.42 ; -7.5,-0.88 -6.5,-0.88 -6.5,0.12 ; -7.5,1.66 -6.5,1.66 -6.5,2.66 ; -7.5,4.2 -6.5,4.2 -6.5,5.2 ; -1,0 0,0 0,1 ; 3.35,-2.8 4.35,-2.8 4.35,-1.8 ; 3.35,3.2 4.35,3.2 4.35,4.2 ; -6.625,-3.67 -6.625,-3.17 -6.375,-3.17 -6.375,-3.67 -6.625,-3.67 ; -6.625,-1.13 -6.625,-0.63 -6.375,-0.63 -6.375,-1.13 -6.625,-1.13 ; -6.625,1.41 -6.625,1.91 -6.375,1.91 -6.375,1.41 -6.625,1.41 ; -6.625,3.95 -6.625,4.45 -6.375,4.45 -6.375,3.95 -6.625,3.95
Mechanical 14:
  lines w0.1: 4.35,1.45 4.35,-1.05 ; 4.35,-1.05 3.85,-0.05 4.85,-0.05 4.35,-1.05 ; -9.5,-7.7 9.5,-7.7 9.5,7.7 -9.5,7.7 -9.5,-7.7
  text "-" at 5.985,-3.3 h1
  text "+" at 5.985,2.7 h1
  text "0" at -4.865,3.7 h1
  text "0" at -4.865,1.16 h1
  text "+V" at -4.865,-1.38 h1
  text "OUT" at -4.865,-3.92 h1
3D body "SENS_LEM_HX 10-P-SP2.stp": height 20, standoff -4, extent -9.5,-7.7 9.5,7.7

## SENS_LEM_HX 15-P [mm] "LEM Current Transducer, Body 19x15.4mm (max)"
height 20
pads (6):
  round 1.6 hole 0.9: 1(-6.5,4.2) 2(-6.5,1.66) 3(-6.5,-0.88) 4(-6.5,-3.42)
  round 2.4 hole 1.7: 5(4.35,3.2) 6(4.35,-2.8)
Top Overlay:
  lines w0.2: 4.35,1.45 4.35,-1.05 ; 4.35,-1.05 3.85,-0.05 4.85,-0.05 4.35,-1.05 ; -9.5,-7.7 9.5,-7.7 9.5,7.7 -9.5,7.7 -9.5,-7.7
  text "-V" at -4.865,3.7 h1
  text "0" at -4.865,1.16 h1
  text "+V" at -4.865,-1.38 h1
  text "OUT" at -4.865,-3.92 h1
  text "+" at 5.985,2.7 h1
  text "-" at 5.985,-3.3 h1
Mechanical 8:
  circle w0.1: c4.35,3.2 r0.3
  circle w0.1: c4.35,-2.8 r0.3
  lines w0.1: -7.5,-3.42 -6.5,-3.42 -6.5,-2.42 ; -7.5,-0.88 -6.5,-0.88 -6.5,0.12 ; -7.5,1.66 -6.5,1.66 -6.5,2.66 ; -7.5,4.2 -6.5,4.2 -6.5,5.2 ; -1,0 0,0 0,1 ; 3.35,-2.8 4.35,-2.8 4.35,-1.8 ; 3.35,3.2 4.35,3.2 4.35,4.2 ; -6.625,-3.67 -6.375,-3.67 -6.375,-3.17 -6.625,-3.17 -6.625,-3.67 ; -6.625,-1.13 -6.375,-1.13 -6.375,-0.63 -6.625,-0.63 -6.625,-1.13 ; -6.625,1.41 -6.375,1.41 -6.375,1.91 -6.625,1.91 -6.625,1.41 ; -6.625,3.95 -6.375,3.95 -6.375,4.45 -6.625,4.45 -6.625,3.95
Mechanical 14:
  lines w0.1: 4.35,1.45 4.35,-1.05 ; 4.35,-1.05 4.85,-0.05 3.85,-0.05 4.35,-1.05 ; -9.5,-7.7 -9.5,7.7 9.5,7.7 9.5,-7.7 -9.5,-7.7
  text "OUT" at -4.865,-3.92 h1
  text "+V" at -4.865,-1.38 h1
  text "0" at -4.865,1.16 h1
  text "-V" at -4.865,3.7 h1
  text "+" at 5.985,2.7 h1
  text "-" at 5.985,-3.3 h1
3D body "SENS_LEM_HX 15-P.stp": height 20, standoff -4, extent -9.5,-7.7 9.5,7.7

## SENS_LEM_LA 25-NP [mm] "LEM Current Transducer, Body 29.2x26mm"
height 16.5
pads (13):
  round 1.9 hole 1.2: 1(11.16,-5.08) 2(11.16,-2.54) 3(11.16,0) 4(11.16,2.54) 5(11.16,5.08) 6(2.27,5.08) 7(2.27,2.54) 8(2.27,0) 9(2.27,-2.54) 10(2.27,-5.08)
  round 2 hole 1.3: +(-9.16,0) -(-9.16,-7.62) M(-9.16,7.62)
Top Overlay:
  lines w0.2: -14.6,-12 ccw(c-13.6,-12) -13.6,-13 13.6,-13 ccw(c13.6,-12) 14.6,-12 14.6,12 ccw(c13.6,12) 13.6,13 -13.6,13 ccw(c-13.6,12) -14.6,12 -14.6,-12
  text "10" at 3.794,-5.544 h1
  text "6" at 3.794,4.616 h1
  text "1" at 12.684,-5.539 h1
  text "5" at 12.684,4.616 h1
  text "-" at -11.589,-8.061 h1
  text "M" at -11.73,7.104 h1
  text "+" at -11.7,-0.425 h1
Mechanical 8:
  lines w0.1: -9.66,-7.62 -9.16,-7.62 ; -9.66,0 -9.16,0 ; -9.66,7.62 -9.16,7.62 ; -9.16,-8.12 -9.16,-7.62 ; -9.16,-7.12 -9.16,-7.62 ; -9.16,-0.5 -9.16,0 ; -9.16,0.5 -9.16,0 ; -9.16,7.12 -9.16,7.62 ; -9.16,8.12 -9.16,7.62 ; -8.66,-7.62 -9.16,-7.62 ; -8.66,0 -9.16,0 ; -8.66,7.62 -9.16,7.62 ; -0.5,0 0,0 ; 0,-0.5 0,0 ; 0,0.5 0,0 ; 0.5,0 0,0 ; 1.77,-5.08 2.27,-5.08 ; 1.77,-2.54 2.27,-2.54 ; 1.77,0 2.27,0 ; 1.77,2.54 2.27,2.54 ; 1.77,5.08 2.27,5.08 ; 2.27,-5.58 2.27,-5.08 ; 2.27,-4.58 2.27,-5.08 ; 2.27,-3.04 2.27,-2.54 ; 2.27,-2.04 2.27,-2.54 ; 2.27,-0.5 2.27,0 ; 2.27,0.5 2.27,0 ; 2.27,2.04 2.27,2.54 ; 2.27,3.04 2.27,2.54 ; 2.27,4.58 2.27,5.08 ; 2.27,5.58 2.27,5.08 ; 2.77,-5.08 2.27,-5.08 ; 2.77,-2.54 2.27,-2.54 ; 2.77,0 2.27,0 ; 2.77,2.54 2.27,2.54 ; 2.77,5.08 2.27,5.08 ; 10.66,-5.08 11.16,-5.08 ; 10.66,-2.54 11.16,-2.54 ; 10.66,0 11.16,0 ; 10.66,2.54 11.16,2.54 ; 10.66,5.08 11.16,5.08 ; 11.16,-5.58 11.16,-5.08 ; 11.16,-4.58 11.16,-5.08 ; 11.16,-3.04 11.16,-2.54 ; 11.16,-2.04 11.16,-2.54 ; 11.16,-0.5 11.16,0 ; 11.16,0.5 11.16,0 ; 11.16,2.04 11.16,2.54 ; 11.16,3.04 11.16,2.54 ; 11.16,4.58 11.16,5.08 ; 11.16,5.58 11.16,5.08 ; 11.66,-5.08 11.16,-5.08 ; 11.66,-2.54 11.16,-2.54 ; 11.66,0 11.16,0 ; 11.66,2.54 11.16,2.54 ; 11.66,5.08 11.16,5.08
Mechanical 14:
  lines w0.1: -14.6,-12 ccw(c-13.6,-12) -13.6,-13 13.6,-13 ccw(c13.6,-12) 14.6,-12 14.6,12 ccw(c13.6,12) 13.6,13 -13.6,13 ccw(c-13.6,12) -14.6,12 -14.6,-12
  text "10" at 3.794,-5.544 h1
  text "6" at 3.794,4.616 h1
  text "1" at 12.684,-5.539 h1
  text "5" at 12.684,4.616 h1
  text "+" at -11.7,-0.425 h1
  text "M" at -11.73,7.104 h1
  text "-" at -11.589,-8.061 h1
3D body "SENS_LEM_LA 25-NP.stp": height 16.5, standoff -3.8, extent -14.6,-13 14.6,13

## SENS_LEM_LA 25-NP/SP14 [mm] "LEM Current Transducer, Body 29.2x26mm"
height 16.45
pads (5):
  round 2 hole 1.3: 1(-9.16,7.62) 2(-9.16,0) 3(-9.16,-7.62)
  round 1.9 hole 1.2: 4(11.16,-7.62) 5(11.16,7.62)
Top Overlay:
  lines w0.2: -14.6,-12 ccw(c-13.6,-12) -13.6,-13 13.6,-13 ccw(c13.6,-12) 14.6,-12 14.6,12 ccw(c13.6,12) 13.6,13 -13.6,13 ccw(c-13.6,12) -14.6,12 -14.6,-12
  text "-" at 12.684,7.231 h1
  text "+" at 12.565,-7.223 h1
  text "+V" at -12.7,-0.5 h1
  text "M" at -11.43,7.104 h1
  text "-V" at -12.589,-8.136 h1
Mechanical 8:
  lines w0.1: -9.66,-7.62 -9.16,-7.62 ; -9.66,0 -9.16,0 ; -9.66,7.62 -9.16,7.62 ; -9.16,-8.12 -9.16,-7.62 ; -9.16,-7.12 -9.16,-7.62 ; -9.16,-0.5 -9.16,0 ; -9.16,0.5 -9.16,0 ; -9.16,7.12 -9.16,7.62 ; -9.16,8.12 -9.16,7.62 ; -8.66,-7.62 -9.16,-7.62 ; -8.66,0 -9.16,0 ; -8.66,7.62 -9.16,7.62 ; -0.5,0 0,0 ; 0,-0.5 0,0 ; 0,0.5 0,0 ; 0.5,0 0,0 ; 10.66,-7.62 11.16,-7.62 ; 10.66,7.62 11.16,7.62 ; 11.16,-8.12 11.16,-7.62 ; 11.16,-7.12 11.16,-7.62 ; 11.16,7.12 11.16,7.62 ; 11.16,8.12 11.16,7.62 ; 11.66,-7.62 11.16,-7.62 ; 11.66,7.62 11.16,7.62
Mechanical 14:
  lines w0.1: -14.6,-12 ccw(c-13.6,-12) -13.6,-13 13.6,-13 ccw(c13.6,-12) 14.6,-12 14.6,12 ccw(c13.6,12) 13.6,13 -13.6,13 ccw(c-13.6,12) -14.6,12 -14.6,-12
  text "-" at 12.684,7.231 h1
  text "+" at 12.565,-7.223 h1
  text "-V" at -12.589,-8.136 h1
  text "M" at -11.43,7.104 h1
  text "+V" at -12.7,-0.5 h1
3D body "SENS_LEM_LA 25-NP-SP14.stp": height 16.45, standoff -3, extent -14.6,-13 14.6,13

## SENS_LEM_LV 25-P [mm] "LEM Current Transducer, Body 29.2x26mm"
height 16.45
pads (5):
  round 2 hole 1.3: 1(-9.16,7.62) 2(-9.16,0) 3(-9.16,-7.62)
  round 1.9 hole 1.2: 4(11.16,-7.62) 5(11.16,7.62)
Top Overlay:
  lines w0.2: -14.7,-12.1 ccw(c-13.7,-12.1) -13.7,-13.1 13.7,-13.1 ccw(c13.7,-12.1) 14.7,-12.1 14.7,12.1 ccw(c13.7,12.1) 13.7,13.1 -13.7,13.1 ccw(c-13.7,12.1) -14.7,12.1 -14.7,-12.1
  text "+" at -11.725,-0.5 h1
  text "M" at -11.755,7.154 h1
  text "-" at -11.832,-8.086 h1
  text "HT-" at 9.909,9.131 h1
  text "HT+" at 9.915,-10.298 h1
Mechanical 8:
  lines w0.1: -9.66,-7.62 -9.16,-7.62 ; -9.66,0 -9.16,0 ; -9.66,7.62 -9.16,7.62 ; -9.16,-8.12 -9.16,-7.62 ; -9.16,-7.12 -9.16,-7.62 ; -9.16,-0.5 -9.16,0 ; -9.16,0.5 -9.16,0 ; -9.16,7.12 -9.16,7.62 ; -9.16,8.12 -9.16,7.62 ; -8.66,-7.62 -9.16,-7.62 ; -8.66,0 -9.16,0 ; -8.66,7.62 -9.16,7.62 ; -0.5,0 0,0 ; 0,-0.5 0,0 ; 0,0.5 0,0 ; 0.5,0 0,0 ; 10.66,-7.62 11.16,-7.62 ; 10.66,7.62 11.16,7.62 ; 11.16,-8.12 11.16,-7.62 ; 11.16,-7.12 11.16,-7.62 ; 11.16,7.12 11.16,7.62 ; 11.16,8.12 11.16,7.62 ; 11.66,-7.62 11.16,-7.62 ; 11.66,7.62 11.16,7.62
Mechanical 14:
  lines w0.1: -14.7,-12.1 ccw(c-13.7,-12.1) -13.7,-13.1 13.7,-13.1 ccw(c13.7,-12.1) 14.7,-12.1 14.7,12.1 ccw(c13.7,12.1) 13.7,13.1 -13.7,13.1 ccw(c-13.7,12.1) -14.7,12.1 -14.7,-12.1
  text "-" at -11.832,-8.086 h1
  text "M" at -11.755,7.154 h1
  text "+" at -11.725,-0.5 h1
  text "HT-" at 9.909,9.131 h1
  text "HT+" at 9.915,-10.298 h1
3D body "SENS_LEM_LV 25-P.stp": height 16.65, standoff -3.2, extent -14.7,-13.1 14.7,13.1

## SENS_SENSIRION_SENSIRION_SHT7X [mm] "Humidity and Temperature Sensor IC, Body 3.7X13.5mm"
height 13.5
pads (4):
  round 1.15 hole 0.75: 1(0,0) 2(1.27,0) 3(2.54,0) 4(3.81,0)
3D body "v115-075.stp": height 0.02, standoff -1.65, extent 3.235,-0.575 4.385,0.575
3D body "v115-075.stp": height 0.02, standoff -1.65, extent 1.965,-0.575 3.115,0.575
3D body "v115-075.stp": height 0.02, standoff -1.65, extent 0.695,-0.575 1.845,0.575
3D body "v115-075.stp": height 0.02, standoff -1.65, extent -0.575,-0.575 0.575,0.575

## SENS_SHARP_IS471F [mm] "SHARP OPIC Light Detector, 4-Leads, Pitch 1.27mm"
height 8.67
pads (4):
  round 1.2 hole 0.7: 1(-1.905,1.27) 2(-0.635,0) 3(0.635,1.27) 4(1.905,0)
Top Overlay:
  circle w0.25: c-1.905,-1.85 r0.125
  lines w0.2: -1.356,0.45 -2.7,0.45 -2.7,-1.35 2.7,-1.35 2.7,-0.301 ; -1.059,1.35 -0.211,1.35 ; 0.41,0.45 0.41,-0.2 0.86,-0.2 0.86,0.45 ; 2.626,0.45 2.7,0.45 2.7,0.301
Mechanical 14:
  circle w0.25: c-1.905,-1.85 r0.125
  lines w0.1: -2.7,-1.35 2.7,-1.35 2.7,0.45 1.25,0.45 1.25,1.35 -1.25,1.35 -1.25,0.45 -2.7,0.45 -2.7,-1.35 ; -2.13,-0.2 -1.68,-0.2 -1.68,1.47 -2.13,1.47 -2.13,-0.2 ; -0.86,-0.2 -0.41,-0.2 -0.41,0.2 -0.86,0.2 -0.86,-0.2 ; 0.41,-0.2 0.86,-0.2 0.86,1.47 0.41,1.47 0.41,-0.2 ; 1.68,-0.2 2.13,-0.2 2.13,0.2 1.68,0.2 1.68,-0.2
3D body "SENS_SHARP_IS471F.stp": height 8.17, standoff -3.35, extent -2.7,-1.35 2.7,1.47